# Altium footprint library DIP Component.PcbLib: 327 footprints (part 14 of 21)
Each footprint in its own frame and in the unit in brackets; x right, y up, seen from the top. Pads: shape width x height; smd on the part's side, far side on the other; paste and mask are expansions set on the pad; w line width, h text height; cw(c..) or ccw(c..) is an arc to the next point about the centre after c.
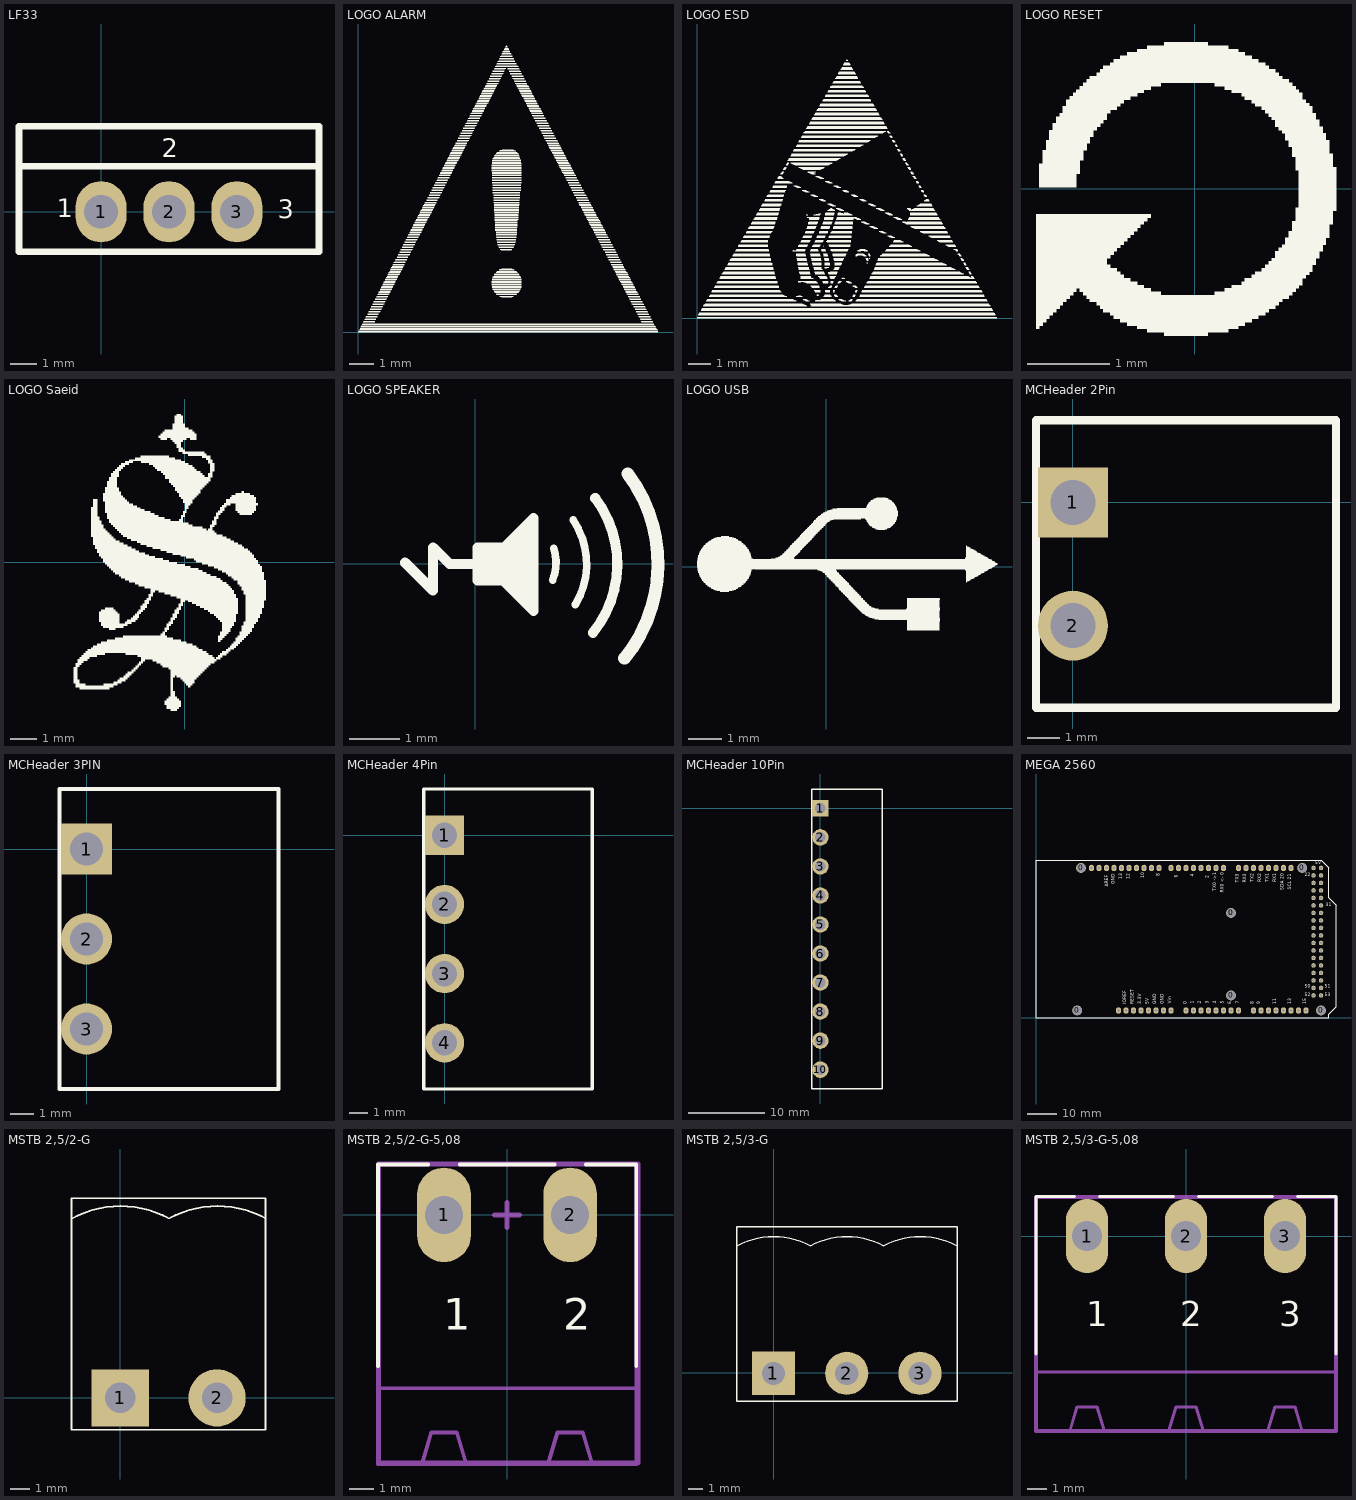
[diagram p13: the footprints below, top view; thin cyan lines are the x and y axes]

## LF33 [mil] "Voltage Regulator 3.3"
pads (3):
  oval 75x90 hole 50: 1(0,0) 2(100,0) 3(200,0)
Top Overlay:
  lines w10: -120.73,66.93 320.73,66.93 ; -120.73,-58.86 -120.73,125.79 320.73,125.79 320.73,-58.86 -120.73,-58.86
  text "1" at -65.35,-7.87 h27.56
  text "2" at 89.48,80.37 h27.56
  text "3" at 260.34,-9.44 h27.56
3D body "User Library-577202B00000G.step": height 1149.61, standoff 399.61, extent -163.99,110.86 356.01,610.86
3D body "to-220.step": height 78.74, standoff -1078.74, extent -101.24,-73.44 298.76,107.66

## LOGO ALARM [mm]
Top Overlay:
  drawing of 1078 lines, arcs and shapes, not listed

## LOGO ESD [mm] "Electrostatic Sensiving Device"
Top Overlay:
  drawing of 1681 lines, arcs and shapes, not listed

## LOGO RESET [mm]
Top Overlay:
  drawing of 1 lines, arcs and shapes, not listed

## LOGO Saeid [mm]
Top Overlay:
  drawing of 3 lines, arcs and shapes, not listed
Top Solder:
  drawing of 3 lines, arcs and shapes, not listed

## LOGO SPEAKER [mm]
Top Overlay:
  lines w0.152: 1.552,-0.324 ccw(c0.686,0.025) 1.574,0.314 ; 1.964,0.879 cw(c0.66,0) 2.008,-0.81
  lines w0.203: -1.397,0.025 -0.838,-0.533 -0.838,0.33 -0.508,0 0,0 ; 0.102,-0.178 0.508,-0.178 ; 0.102,-0.025 0.559,-0.025 ; 0.102,0.152 0.66,0.152 ; 0.508,-0.33 0.051,-0.33 0.051,0.33 0.559,0.33 0.559,-0.33 1.168,-0.94 1.168,0.914 0.559,0.305 ; 0.914,-0.432 0.914,0.432 ; 0.965,-0.508 0.737,-0.279 0.737,0.279 1.067,0.61 1.067,-0.66 ; 2.359,-1.376 ccw(c0.66,0) 2.406,1.315
  lines w0.254: 2.991,-1.888 ccw(c0.66,0) 3.056,1.805

## LOGO USB [mm]
Top Overlay:
  drawing of 1 lines, arcs and shapes, not listed

## MCHeader 2Pin [mil]
pads (2):
  rect 85x85 hole 55: 1(0,0)
  round 85 hole 55: 2(0,-150)
Top Overlay:
  lines w10: -45,-250 -45,100 320,100 320,-250 -45,-250
3D body "mini combicon header 2pin.STEP": height 292.32, standoff -130.12, extent -43.09,-247.85 321.09,99

## MCHeader 3PIN [mil]
pads (3):
  rect 85x85 hole 55: 1(0,0)
  round 85 hole 55: 2(0,-150) 3(0,-300)
Top Overlay:
  lines w7: -45,-400 320,-400 320,100 -45,100 -45,-400
3D body "mini combicon header 3pin.STEP": height 292.32, standoff -130.12, extent -46.09,-399 318.09,97.85

## MCHeader 4Pin [mil]
pads (4):
  rect 85x85 hole 55: 1(0,0)
  round 85 hole 55: 2(0,-150) 3(0,-300) 4(0,-450)
Top Overlay:
  lines w7: -45,-550 -45,100 320,100 320,-550 -45,-550
3D body "mini combicon header 4pin.STEP": height 292.32, standoff -130.12, extent -49.09,-550.85 315.09,96

## MCHeader 10Pin [mil]
pads (10):
  rect 85x85 hole 55: 1(0,0)
  round 85 hole 55: 2(0,-150) 3(0,-300) 4(0,-450) 5(0,-600) 6(0,-750) 7(0,-900) 8(0,-1050) 9(0,-1200) 10(0,-1350)
Top Overlay:
  lines w7: -45,-1450 320,-1450 320,100 -45,100 -45,-1450
3D body "mini combicon header 10pin.STEP": height 292.32, standoff -130.12, extent -47.09,-1446.85 317.09,100

## MEGA 2560 [mil]
pads (93):
  round 130 hole 125 mask+19.68: 0(550,100) 0(600,2000) 0(2600,300) 0(2600,1400) 0(2600,1400) 0(3550,2000) 0(3800,100)
  oval 65x85 hole 40 mask+10: 1(1100,100) 2(1200,100) 3(1300,100) 4(1400,100) 5(1500,100) 6(1600,100) 7(1700,100) 8(1800,100) 9(2000,100) 10(2100,100) 11(2200,100) 12(2300,100) 13(2400,100) 14(2500,100) 15(2600,100) 16(2700,100) 17(2900,100) 18(3000,100) 19(3100,100) 20(3200,100) 21(3300,100) 22(3400,100) 23(3500,100) 24(3600,100) 61(3400,2000) 62(3300,2000) 63(3200,2000) 64(3100,2000) 65(3000,2000) 66(2900,2000) 67(2800,2000) 68(2700,2000) 69(2500,2000) 70(2400,2000) 71(2300,2000) 72(2200,2000) 73(2100,2000) 74(2000,2000) 75(1900,2000) 76(1800,2000) 77(1640,2000) 78(1540,2000) 79(1440,2000) 80(1340,2000) 81(1240,2000) 82(1140,2000) 83(1040,2000) 84(940,2000) 85(840,2000) 86(740,2000)
  round 60 hole 40 mask+10: 25(3700,300) 26(3800,300) 27(3700,400) 28(3800,400) 29(3700,500) 30(3800,500) 31(3700,600) 32(3800,600) 33(3700,700) 34(3800,700) 35(3700,800) 36(3800,800) 37(3700,900) 38(3800,900) 39(3700,1000) 40(3800,1000) 41(3700,1100) 42(3800,1100) 43(3700,1200) 44(3800,1200) 45(3700,1300) 46(3800,1300) 47(3700,1400) 48(3800,1400) 49(3700,1500) 50(3800,1500) 51(3700,1600) 52(3800,1600) 53(3700,1700) 54(3800,1700) 55(3700,1800) 56(3800,1800) 57(3700,1900) 58(3800,1900) 59(3700,2000) 60(3800,2000)
Top Overlay:
  lines w3.94: 0,0 3900,0 3900,50 4000,150 4000,1500 3900,1600 3900,2000 3800,2100 0,2100 0,0
  text "IOREF" at 1220,180 h75
  text "RESET" at 1320,180 h75
  text "3.3V" at 1420,180 h75
  text "5V" at 1520,180 h75
  text "GND" at 1620,180 h75
  text "GND" at 1720,180 h75
  text "Vin" at 1820,190 h75
  text "0" at 2030,180 h75
  text "1" at 2120,190 h75
  text "2" at 2220,190 h75
  text "3" at 2320,190 h75
  text "4" at 2420,190 h75
  text "5" at 2520,190 h75
  text "6" at 2620,180 h75
  text "7" at 2730,190 h75
  text "8" at 2920,180 h75
  text "9" at 3010,180 h75
  text "11" at 3220,180 h75
  text "13" at 3420,180 h75
  text "15" at 3620,180 h75
  text "52" at 3580,270 h75
  text "53" at 3850,270 h75
  text "50" at 3580,380 h75
  text "51" at 3850,380 h75
  text "31" at 3860,1470 h75
  text "22" at 3580,1870 h75
  text "5V" at 3720,2030 h75
  text "SCL 21" at 3420,1710 h75
  text "SDA 20" at 3320,1700 h75
  text "RX1" at 3220,1810 h75
  text "TX1" at 3120,1810 h75
  text "RX2" at 3020,1810 h75
  text "TX2" at 2920,1810 h75
  text "RX3" at 2820,1800 h75
  text "TX3" at 2720,1800 h75
  text "RX0 <- 0" at 2520,1670 h75
  text "TX0 ->1" at 2420,1690 h75
  text "2" at 2320,1860 h75
  text "4" at 2120,1880 h75
  text "6" at 1910,1870 h75
  text "8" at 1670,1890 h75
  text "10" at 1460,1860 h75
  text "12" at 1270,1850 h75
  text "GND" at 1070,1780 h75
  text "13" at 1170,1850 h75
  text "AREF" at 980,1750 h75

## MSTB 2,5/2-G [mm] "Header, Nominal current: 12 A Rated voltage (III/2): 320 V Number of positions: 2 Pitch: 5.08 mm Color: green Contact surface: Tin Assembly: Soldering"
pads (2):
  rect 3x3 hole 1.6: 1(0,0)
  round 3 hole 1.6: 2(5.08,0)
Top Overlay:
  lines w0.1: -2.5,9.41 cw(c0.02,4.728) 2.54,9.41 ; 2.58,9.41 cw(c5.1,4.728) 7.621,9.41 ; -2.54,-1.67 7.62,-1.67 7.62,10.46 -2.54,10.46 -2.54,-1.67
3D body "Socket Green_V2009.STEP": height 7.88, standoff -3.09, extent -2.631,-1.544 7.705,10.394

## MSTB 2,5/2-G-5,08 [mil] "Header, Nominal current: 12 A Rated voltage (III/2): 320 V Number of positions: 2 Pitch: 5.08 mm Color: green Contact surface: Tin Assembly: Soldering DESIGNER:ABBAS BASEREH"
height 338.58
pads (2):
  oval 85x150 hole 60: 1(-100,0) 2(100,0)
Top Overlay:
  lines w6: -204.72,-239.72 -204.72,80 -125,80 ; -75,80 75,80 ; 125,80 204.72,80 204.72,-239.72
  text "1" at -101.26,-182.48 h50
  text "2" at 88.74,-182.48 h50
Mechanical 13:
  lines w6: -204.72,-275 204.72,-275 ; -125,80 -204.72,80 -204.72,-239.72 -204.72,-395 -135,-395 ; -75,80 75,80 ; 125,80 204.72,80 204.72,-239.72 204.72,-395 135,-395 ; -135,-395 -120,-345 -80,-345 -65,-395 ; -135,-395 -65,-395 ; -65,-395 65,-395 ; 65,-395 80,-345 120,-345 135,-395 ; 65,-395 135,-395
Mechanical 15:
  lines w7.87: -19.68,0 19.68,0 ; 0,-19.68 0,19.68 ; -203.74,-393.7 207.68,-393.7 207.68,80.71 -203.74,80.71 -203.74,-393.7
3D body "User Library-MSTB 2,5-2-G-5,08 1770711.STEP": height 339.58, standoff -136.8, extent -199.21,-393.75 200.79,78.79

## MSTB 2,5/3-G [mm]
pads (3):
  rect 3x3 hole 1.6: 1(-0.025,-0.025)
  round 3 hole 1.6: 2(5.055,-0.025) 3(10.135,-0.025)
Top Overlay:
  lines w0.1: -2.525,8.815 cw(c-0.005,4.133) 2.515,8.815 ; 2.555,8.815 cw(c5.075,4.133) 7.595,8.815 ; 7.635,8.815 cw(c10.155,4.133) 12.675,8.815 ; -2.565,-1.98 12.7,-1.98 12.7,10.15 -2.565,10.15 -2.565,-1.98
3D body "User Library-Phoenix Contact MSTB-2_5_3G.step": height 8.7, standoff -3.4, extent -2.56,-1.91 12.68,10.09

## MSTB 2,5/3-G-5,08 [mil] "Header, Nominal current: 12 A Rated voltage (III/2): 320 V Number of positions: 3 Pitch: 5.08 mm Color: green Contact surface: Tin Assembly: Soldering  DESIGNER:ABBAS BASEREH"
height 338.58
pads (3):
  oval 85x150 hole 60: 1(-200,0) 2(0,0) 3(200,0)
Top Overlay:
  lines w6: -303.15,-238.15 -303.15,80 -225,80 ; -175,80 -25,80 ; 25,80 175,80 ; 225,80 303.15,80 303.15,-238.15
  text "3" at 188.74,-182.48 h50
  text "2" at -11.26,-182.48 h50
  text "1" at -201.26,-182.48 h50
Mechanical 13:
  lines w6: -303.15,-275 303.15,-275 ; -225,80 -303.15,80 -303.15,-238.15 -303.15,-395 -235,-395 ; -175,80 -25,80 ; 25,80 175,80 ; 225,80 303.15,80 303.15,-238.15 303.15,-395 235,-395 ; -235,-395 -165,-395 ; -235,-395 -220,-345 -180,-345 -165,-395 ; -165,-395 -35,-395 ; -35,-395 35,-395 ; -35,-395 -20,-345 20,-345 35,-395 ; 35,-395 165,-395 ; 165,-395 180,-345 220,-345 235,-395 ; 165,-395 235,-395
Mechanical 15:
  lines w7.87: -303.15,-393.7 303.15,-393.7 303.15,78.74 -303.15,78.74 -303.15,-393.7
3D body "User Library-MSTB 2,5-3-G-5,08 1759020.STEP": height 339.58, standoff -136.8, extent -300,-393.79 300,78.74